# Altium footprint library Connectors.PcbLib: 245 footprints (part 12 of 16)
Each footprint in its own frame and in the unit in brackets; x right, y up, seen from the top. Pads: shape width x height; smd on the part's side, far side on the other; paste and mask are expansions set on the pad; w line width, h text height; cw(c..) or ccw(c..) is an arc to the next point about the centre after c.
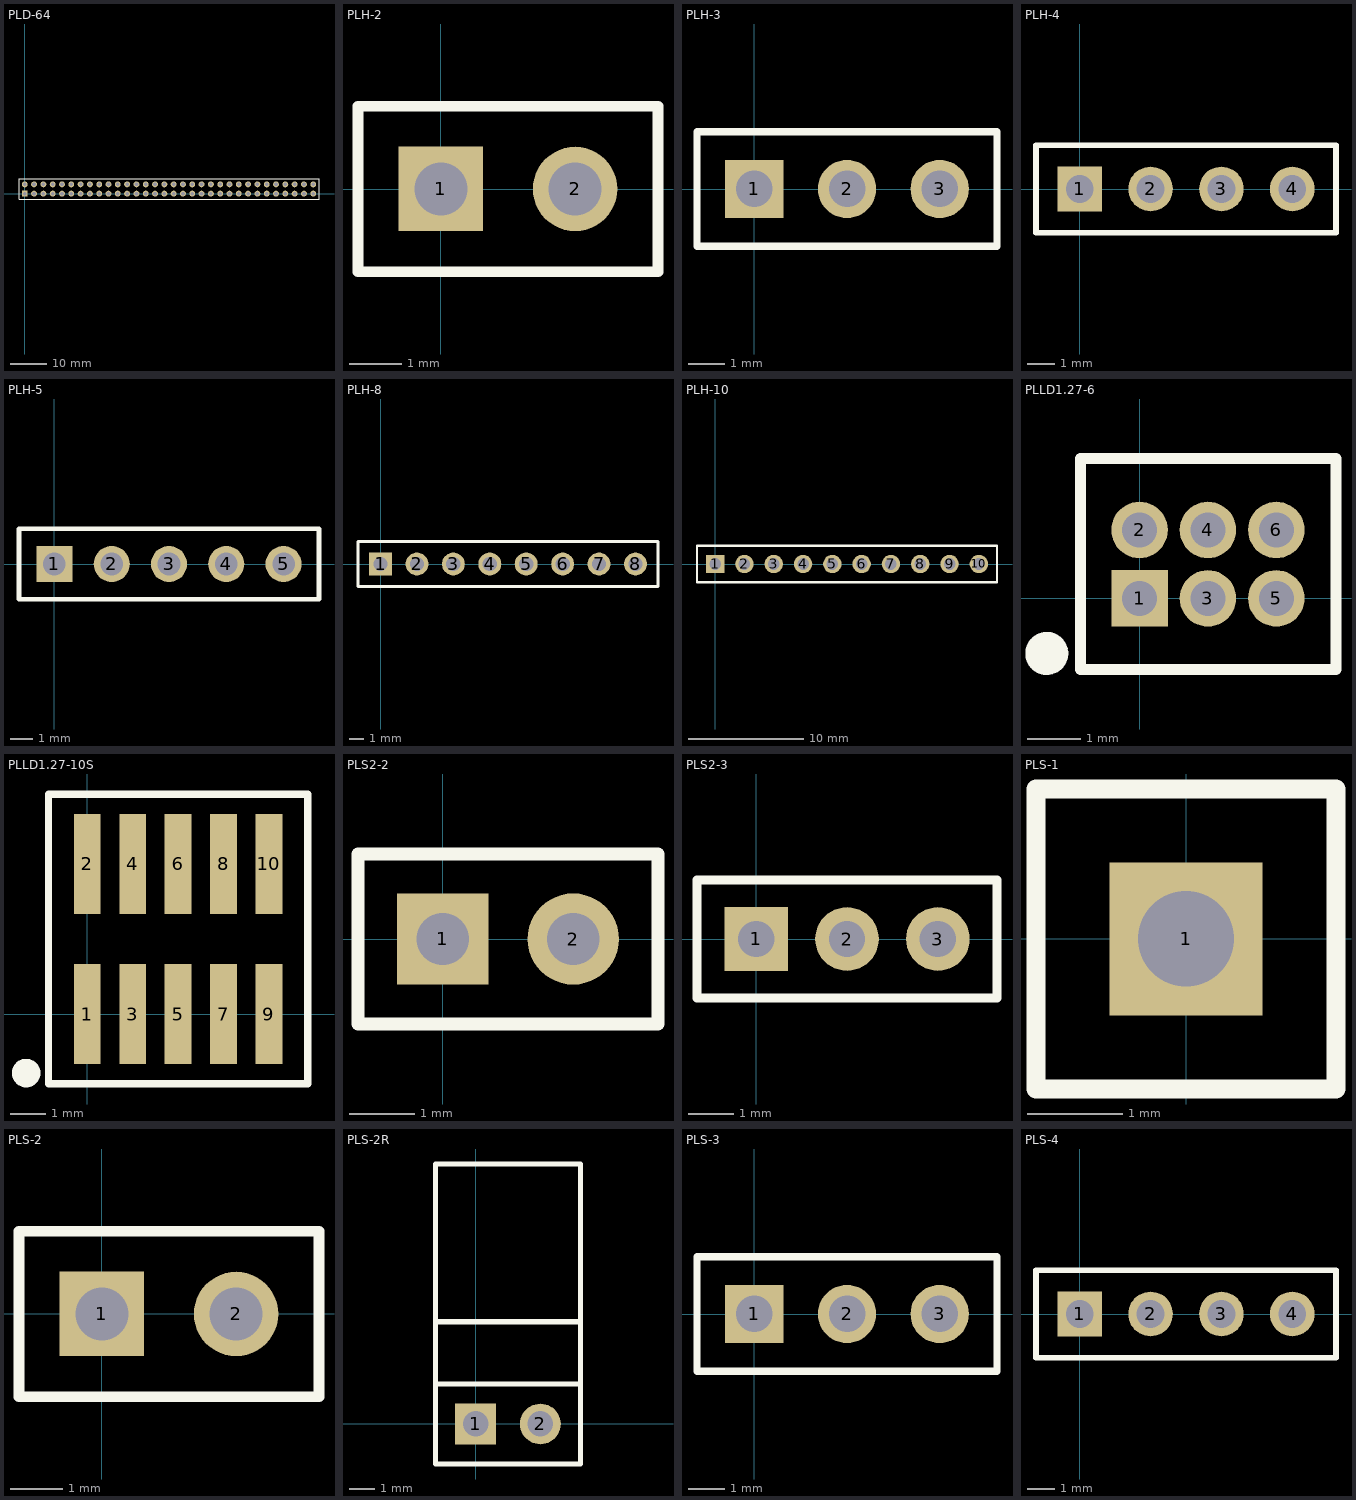
[diagram p11: the footprints below, top view; thin cyan lines are the x and y axes]

## PLD-64 [mm]
pads (64):
  rect 1.6x1.6 hole 1: 1(0,0)
  round 1.6 hole 1: 2(0,2.54) 3(2.54,0) 4(2.54,2.54) 5(5.08,0) 6(5.08,2.54) 7(7.62,0) 8(7.62,2.54) 9(10.16,0) 10(10.16,2.54) 11(12.7,0) 12(12.7,2.54) 13(15.24,0) 14(15.24,2.54) 15(17.78,0) 16(17.78,2.54) 17(20.32,0) 18(20.32,2.54) 19(22.86,0) 20(22.86,2.54) 21(25.4,0) 22(25.4,2.54) 23(27.94,0) 24(27.94,2.54) 25(30.48,0) 26(30.48,2.54) 27(33.02,0) 28(33.02,2.54) 29(35.56,0) 30(35.56,2.54) 31(38.1,0) 32(38.1,2.54) 33(40.64,0) 34(40.64,2.54) 35(43.18,0) 36(43.18,2.54) 37(45.72,0) 38(45.72,2.54) 39(48.26,0) 40(48.26,2.54) 41(50.8,0) 42(50.8,2.54) 43(53.34,0) 44(53.34,2.54) 45(55.88,0) 46(55.88,2.54) 47(58.42,0) 48(58.42,2.54) 49(60.96,0) 50(60.96,2.54) 51(63.5,0) 52(63.5,2.54) 53(66.04,0) 54(66.04,2.54) 55(68.58,0) 56(68.58,2.54) 57(71.12,0) 58(71.12,2.54) 59(73.66,0) 60(73.66,2.54) 61(76.2,0) 62(76.2,2.54) 63(78.74,0) 64(78.74,2.54)
Top Overlay:
  lines w0.2: -1.57,-1.57 -1.57,4.11 80.31,4.11 80.31,-1.57 -1.57,-1.57
3D body "PLD-64.step": height 8.7, standoff -3, extent -1.27,-1.27 80.01,3.81

## PLH-2 [mm]
pads (2):
  rect 1.6x1.6 hole 1: 1(0,0)
  round 1.6 hole 1: 2(2.54,0)
Top Overlay:
  lines w0.2: -1.57,-1.57 4.11,-1.57 4.11,1.57 -1.57,1.57 -1.57,-1.57
3D body "PLH-2.step": height 15.9, standoff -3, extent -1.27,-1.27 3.81,1.27

## PLH-3 [mm]
pads (3):
  rect 1.6x1.6 hole 1: 1(0,0)
  round 1.6 hole 1: 2(2.54,0) 3(5.08,0)
Top Overlay:
  lines w0.2: -1.57,-1.57 6.65,-1.57 6.65,1.57 -1.57,1.57 -1.57,-1.57
3D body "PLH-3.stp": height 15.9, standoff -3, extent -1.27,-1.27 6.35,1.27

## PLH-4 [mm]
pads (4):
  rect 1.6x1.6 hole 1: 1(0,0)
  round 1.6 hole 1: 2(2.54,0) 3(5.08,0) 4(7.62,0)
Top Overlay:
  lines w0.2: -1.57,-1.57 -1.57,1.57 9.19,1.57 9.19,-1.57 -1.57,-1.57
3D body "PLH-4.step": height 15.9, standoff -3, extent -1.27,-1.27 8.89,1.27

## PLH-5 [mm]
pads (5):
  rect 1.6x1.6 hole 1: 1(0,0)
  round 1.6 hole 1: 2(2.54,0) 3(5.08,0) 4(7.62,0) 5(10.16,0)
Top Overlay:
  lines w0.2: -1.57,-1.57 11.73,-1.57 11.73,1.57 -1.57,1.57 -1.57,-1.57
3D body "PLH-5.step": height 15.9, standoff -3, extent -1.27,-1.27 11.43,1.27

## PLH-8 [mm]
pads (8):
  rect 1.6x1.6 hole 1: 1(0,0)
  round 1.6 hole 1: 2(2.54,0) 3(5.08,0) 4(7.62,0) 5(10.16,0) 6(12.7,0) 7(15.24,0) 8(17.78,0)
Top Overlay:
  lines w0.2: -1.57,-1.57 19.35,-1.57 19.35,1.57 -1.57,1.57 -1.57,-1.57
3D body "PLH-8.step": height 15.9, standoff -3, extent -1.27,-1.27 19.05,1.27

## PLH-10 [mm]
pads (10):
  rect 1.6x1.6 hole 1: 1(0,0)
  round 1.6 hole 1: 2(2.54,0) 3(5.08,0) 4(7.62,0) 5(10.16,0) 6(12.7,0) 7(15.24,0) 8(17.78,0) 9(20.32,0) 10(22.86,0.001)
Top Overlay:
  lines w0.2: -1.57,-1.57 24.43,-1.57 24.43,1.57 -1.57,1.57 -1.57,-1.57
3D body "PLH-10.step": height 15.9, standoff -3, extent -1.27,-1.27 24.13,1.27

## PLLD1.27-6 [mm]
pads (6):
  rect 1.05x1.05 hole 0.65: 1(0,0)
  round 1.05 hole 0.65: 2(0,1.27) 3(1.27,0) 4(1.27,1.27) 5(2.54,0) 6(2.54,1.27)
Top Overlay:
  circle w0.4: c-1.725,-1.025 r0.2
  lines w0.2: -1.1,-1.325 3.65,-1.325 3.65,2.6 -1.1,2.6 -1.1,-1.325
3D body "PLLD1.27-6.step": height 4.7, standoff -2.6, extent -0.635,-0.865 3.175,2.135

## PLLD1.27-10S [mm]
pads (10):
  rect 0.75x2.8 smd: 1(0,0) 2(0,4.2) 3(1.27,0) 4(1.27,4.2) 5(2.54,0) 6(2.54,4.2) 7(3.81,0) 8(3.81,4.2) 9(5.08,0) 10(5.08,4.2)
Top Overlay:
  circle w0.4: c-1.71,-1.65 r0.2
  lines w0.2: -1.085,-1.95 -1.085,6.15 6.165,6.15 6.165,-1.95 -1.085,-1.95
3D body "User Library-PLLD1_27-xx-S.step": height 3.9, standoff 0, extent -0.635,-0.4 5.715,4.6

## PLS2-2 [mm]
pads (2):
  rect 1.4x1.4 hole 0.8: 1(0,0)
  round 1.4 hole 0.8: 2(2,0)
Top Overlay:
  lines w0.2: -1.3,-1.3 -1.3,1.3 3.3,1.3 3.3,-1.3 -1.3,-1.3
3D body "PLS2-2.STEP": height 6, standoff -2.8, extent -1,-1 3,1

## PLS2-3 [mm]
pads (3):
  rect 1.4x1.4 hole 0.8: 1(0,0)
  round 1.4 hole 0.8: 2(2,0) 3(4,0)
Top Overlay:
  lines w0.2: -1.3,-1.3 -1.3,1.3 5.3,1.3 5.3,-1.3 -1.3,-1.3
3D body "PLS2-3.STEP": height 6, standoff -2.8, extent -1,-1 5,1

## PLS-1 [mm]
pads (1):
  rect 1.6x1.6 hole 1: 1(0,0)
Top Overlay:
  lines w0.2: -1.57,-1.57 1.57,-1.57 1.57,1.57 -1.57,1.57 -1.57,-1.57
3D body "PLS-1.stp": height 8.7, standoff -3, extent -1.27,-1.27 1.27,1.27

## PLS-2 [mm]
pads (2):
  rect 1.6x1.6 hole 1: 1(0,0)
  round 1.6 hole 1: 2(2.54,0)
Top Overlay:
  lines w0.2: -1.57,-1.57 4.11,-1.57 4.11,1.57 -1.57,1.57 -1.57,-1.57
3D body "PLS-2.stp": height 8.7, standoff -3, extent -1.27,-1.27 3.81,1.27

## PLS-2R [mm] "Вилка штыревая 2.54мм 1х2 угловая (тип D1)"
pads (2):
  rect 1.6x1.6 hole 1: 1(0,0)
  round 1.6 hole 1: 2(2.54,0)
Top Overlay:
  lines w0.2: -1.57,1.57 4.11,1.57 ; -1.57,4.01 4.11,4.01 ; -1.57,-1.57 -1.57,10.2 4.11,10.2 4.11,-1.57 -1.57,-1.57
3D body "PLS-R.STEP": height 2.44, standoff -3.05, extent -1.27,-0.32 3.81,9.9

## PLS-3 [mm]
pads (3):
  rect 1.6x1.6 hole 1: 1(0,0)
  round 1.6 hole 1: 2(2.54,0) 3(5.08,0)
Top Overlay:
  lines w0.2: -1.57,-1.57 -1.57,1.57 6.65,1.57 6.65,-1.57 -1.57,-1.57
3D body "PLS-3.stp": height 8.7, standoff -3, extent -1.27,-1.27 6.35,1.27

## PLS-4 [mm]
pads (4):
  rect 1.6x1.6 hole 1: 1(0,0)
  round 1.6 hole 1: 2(2.54,0) 3(5.08,0) 4(7.62,0)
Top Overlay:
  lines w0.2: -1.57,-1.57 9.19,-1.57 9.19,1.57 -1.57,1.57 -1.57,-1.57
3D body "PLS-4.stp": height 8.7, standoff -3, extent -1.27,-1.27 8.89,1.27